# Altium footprint library UZohmADC.PcbLib: 54 footprints (part 2 of 4)
Each footprint in its own frame and in the unit in brackets; x right, y up, seen from the top. Pads: shape width x height; smd on the part's side, far side on the other; paste and mask are expansions set on the pad; w line width, h text height; cw(c..) or ccw(c..) is an arc to the next point about the centre after c.
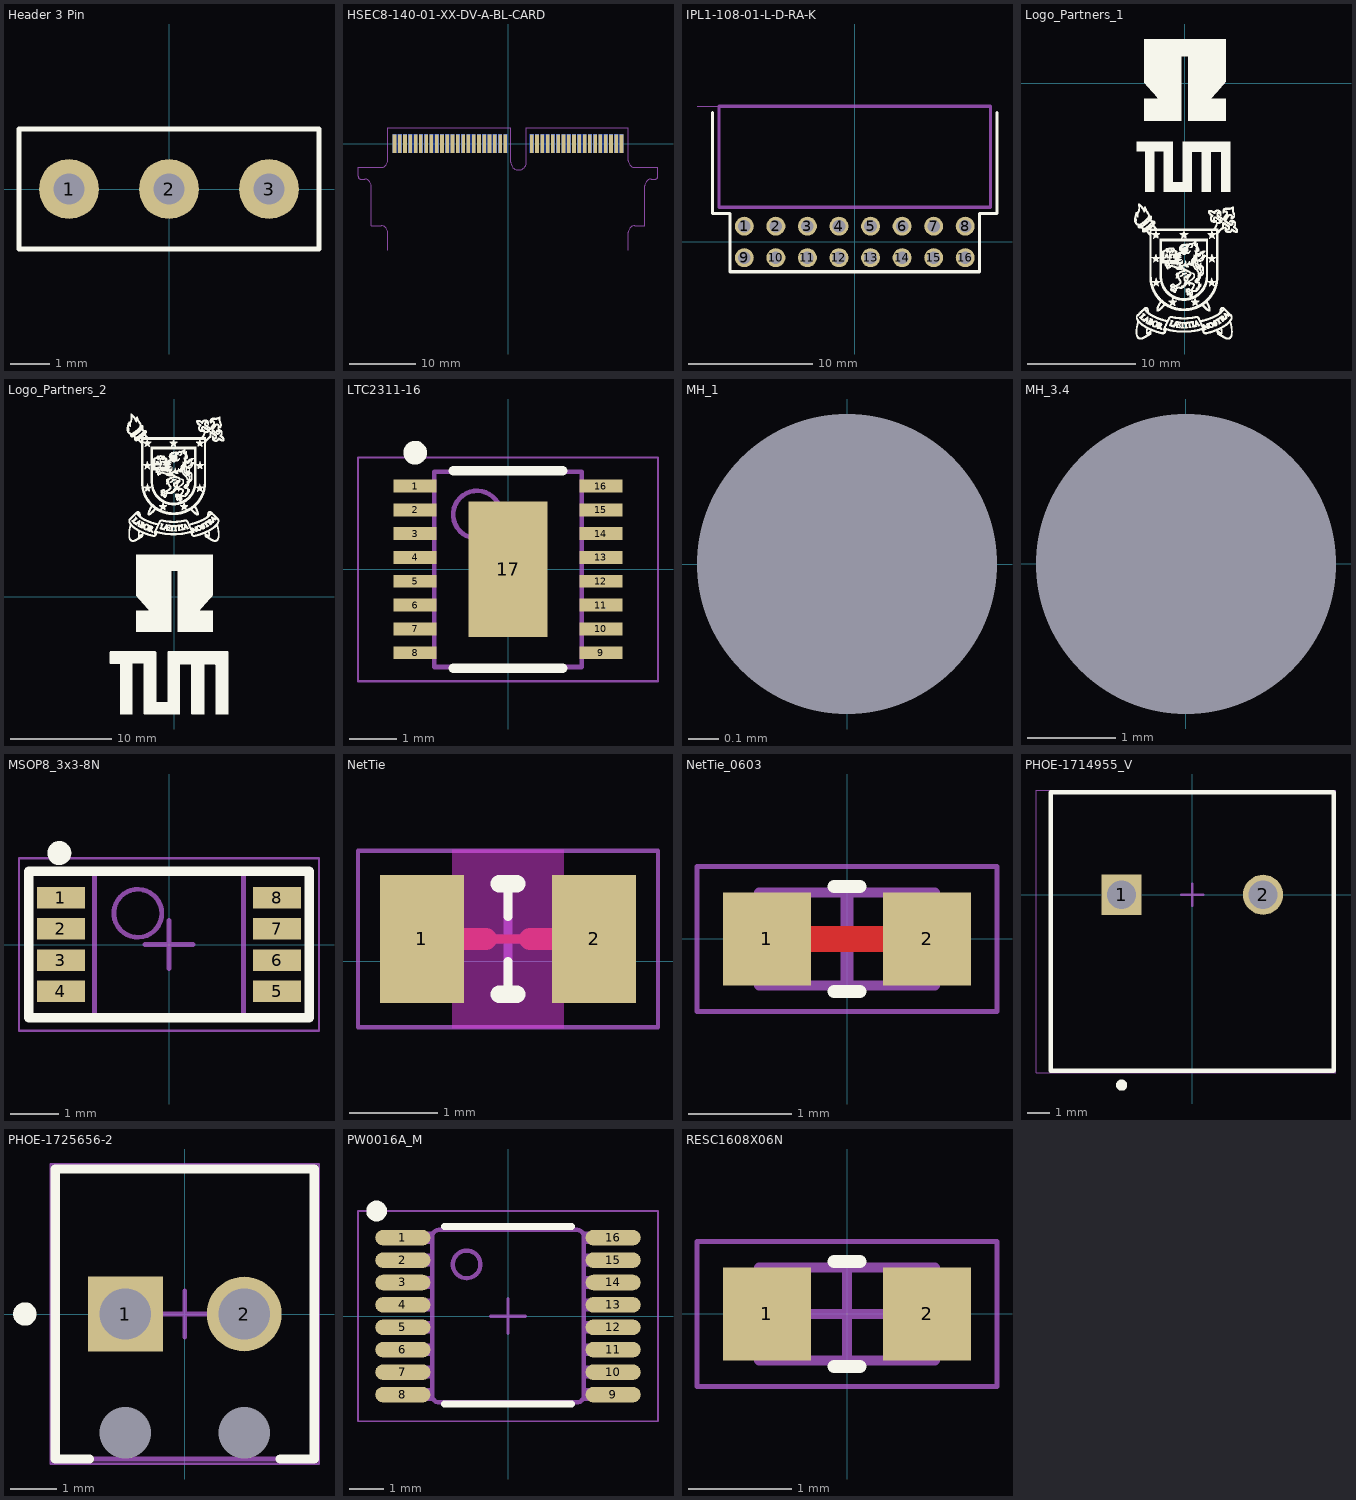
[diagram p1: the footprints below, top view; thin cyan lines are the x and y axes]

## Header 3 Pin [mil]
pads (3):
  round 60 hole 31.5: 1(-100,0) 2(0,0) 3(100,0)
Top Overlay:
  lines w5: -150,-60 -150,60 150,60 150,-60 -150,-60
3D body "zl201-3_p2-54_l7-62_w2-54_h8-89.stp": height 350, standoff -120, extent -150,-50 150,50

## HSEC8-140-01-XX-DV-A-BL-CARD [mm]
pads (80):
  rect 0.55x2.8 smd far side mask+0.05: 1(-17.2,0) 3(-16.4,0) 5(-15.6,0) 7(-14.8,0) 9(-14,0) 11(-13.2,0) 13(-12.4,0) 15(-11.6,0) 17(-10.8,0) 19(-10,0) 21(-9.2,0) 23(-8.4,0) 25(-7.6,0) 27(-6.8,0) 29(-6,0) 31(-5.2,0) 33(-4.4,0) 35(-3.6,0) 37(-2.8,0) 39(-2,0) 41(-1.2,0) 43(-0.4,0) 45(3.6,0) 47(4.4,0) 49(5.2,0) 51(6,0) 53(6.8,0) 55(7.6,0) 57(8.4,0) 59(9.2,0) 61(10,0) 63(10.8,0) 65(11.6,0) 67(12.4,0) 69(13.2,0) 71(14,0) 73(14.8,0) 75(15.6,0) 77(16.4,0) 79(17.2,0)
  rect 0.55x2.8 smd mask+0.05: 2(-17.2,0) 4(-16.4,0) 6(-15.6,0) 8(-14.8,0) 10(-14,0) 12(-13.2,0) 14(-12.4,0) 16(-11.6,0) 18(-10.8,0) 20(-10,0) 22(-9.2,0) 24(-8.4,0) 26(-7.6,0) 28(-6.8,0) 30(-6,0) 32(-5.2,0) 34(-4.4,0) 36(-3.6,0) 38(-2.8,0) 40(-2,0) 42(-1.2,0) 44(-0.4,0) 46(3.6,0) 48(4.4,0) 50(5.2,0) 52(6,0) 54(6.8,0) 56(7.6,0) 58(8.4,0) 60(9.2,0) 62(10,0) 64(10.8,0) 66(11.6,0) 68(12.4,0) 70(13.2,0) 72(14,0) 74(14.8,0) 76(15.6,0) 78(16.4,0) 80(17.2,0)
M5:
  lines w0.025: -18.225,-16.166 -18.225,-13.44 ccw(c-19.225,-13.44) -19.225,-12.44 -20.725,-12.44 -20.725,-6.38 ccw(c-21.725,-6.38) -21.725,-5.38 -22.325,-5.38 cw(c-22.325,-4.98) -22.725,-4.98 -22.725,-3.6 -19.225,-3.6 ccw(c-19.225,-2.6) -18.225,-2.6 -18.225,1.621 -18.225,2.4 0.4,2.4 0.4,1.621 0.4,-2.8 ccw(c1.6,-2.8) 2.8,-2.8 2.8,1.621 2.8,2.4 18.225,2.4 18.225,1.621 18.225,-2.6 ccw(c19.225,-2.6) 19.225,-3.6 22.725,-3.6 22.725,-4.98 cw(c22.325,-4.98) 22.325,-5.38 21.725,-5.38 ccw(c21.725,-6.38) 20.725,-6.38 20.725,-12.44 19.225,-12.44 ccw(c19.225,-13.44) 18.225,-13.44 18.225,-16.166
  text ".Designator" at 0,2.4 h1.02

## ID_ProjectRev [mm] "project name + revision number"
Top Overlay:
  text ".ProjectName .ProjectRevision / .Author .Date" at -2.727,-0.335 h1.78

## IPL1-108-01-L-D-RA-K [mil]
pads (16):
  round 60 hole 40 mask+3: 1(-350,50) 2(-250,50) 3(-150,50) 4(-50,50) 5(50,50) 6(150,50) 7(250,50) 8(350,50) 9(-350,-50) 10(-250,-50) 11(-150,-50) 12(-50,-50) 13(50,-50) 14(150,-50) 15(250,-50) 16(350,-50)
Top Overlay:
  lines w10: -450.79,410 -450.79,90.55 -395.79,90.55 -395.79,-94.49 395.79,-94.49 395.79,90 450.79,90 450.79,410
M5:
  lines w10: -430,110 430,110 430,430 -430,430 -430,110
  text ".Designator" at -21.14,260 h30
M16:
  lines w0.1: -500,430 300,430
3D body "IPL1-108-01-F-D-RA-K.stp": height 310, standoff -85, extent -430,-58.32 430,434.18

## Logo_Partners_1 [mm] "THN, TUM and USACH Logo"
Top Overlay:
  drawing of 11309 lines, arcs and shapes, not listed

## Logo_Partners_2 [mm] "USACH, THN and TUM Logo"
Top Overlay:
  drawing of 13619 lines, arcs and shapes, not listed

## LTC2311-16 [mm]
pads (17):
  rect 0.9x0.27 smd mask+0.05: 1(-1.95,1.75) 2(-1.95,1.25) 3(-1.95,0.75) 4(-1.95,0.25) 5(-1.95,-0.25) 6(-1.95,-0.75) 7(-1.95,-1.25) 8(-1.95,-1.75) 9(1.95,-1.75) 10(1.95,-1.25) 11(1.95,-0.75) 12(1.95,-0.25) 13(1.95,0.25) 14(1.95,0.75) 15(1.95,1.25) 16(1.95,1.75)
  rect 1.65x2.85 smd: 17(0,0)
Top Overlay:
  circle w0.25: c-1.95,2.45 r0.125
  lines w0.2: -1.15,-2.075 1.15,-2.075 ; -1.15,2.075 1.15,2.075
M5:
  lines w0.1: -1.55,-2.05 -1.55,2.05 1.55,2.05 1.55,-2.05 -1.55,-2.05
  text ".Designator" at 0,0 h1.02
M13:
  circle w0.1: c-0.65,1.15 r0.5
M15:
  lines w0.05: -3.15,-2.35 3.15,-2.35 3.15,2.35 -3.15,2.35 -3.15,-2.35
  lines w0.1: -0.5,0 0.5,0 ; 0,-0.5 0,0.5
3D body: height 1.1, standoff 0.05, extent -1.55,-2.05 1.55,2.05

## MH_1 [mm]
pads (1):
  round 0 hole 1 unplated: 1(0,0)

## MH_3.4 [mm]
pads (1):
  round 0 hole 3.4 unplated: 1(0,0)

## MSOP8_3x3-8N [mm] "TSOP, 8-Leads, Body 3,00x3,00mm, Pitch 0,65mm, IPC Medium Density"
height 1
pads (8):
  rect 1x0.45 smd mask+0.051: 1(-2.25,0.975) 2(-2.25,0.325) 3(-2.25,-0.325) 4(-2.25,-0.975) 5(2.25,-0.975) 6(2.25,-0.325) 7(2.25,0.325) 8(2.25,0.975)
Top Overlay:
  circle w0.25: c-2.286,1.905 r0.125
  lines w0.2: -2.921,-1.524 -2.921,1.524 2.921,1.524 2.921,-1.524 -2.921,-1.524
M5:
  circle w0.1: c-0.65,0.65 r0.5
  lines w0.1: -1.55,-1.55 -1.55,1.55 1.55,1.55 1.55,-1.55 -1.55,-1.55
  text ".Designator" at 0,0 h1.52
M15:
  lines w0.05: -3.125,-1.8 -3.125,1.8 3.125,1.8 3.125,-1.8 -3.125,-1.8
  lines w0.1: -0.5,0 0.5,0 ; 0,-0.5 0,0.5
3D body "User Library-MSOP8.STEP": height 1.1, standoff 0, extent -2.469,-1.55 2.469,1.55

## NetTie [mm]
pads (2):
  rect 0.95x1.45 smd: 1(-3.769,0.254) 2(-1.819,0.254)
Top Layer:
  lines w0.102: -3.048,0.254 -2.54,0.254
  lines w0.254: -3.769,0.254 -3.048,0.254 ; -2.54,0.254 -1.778,0.254
Top Overlay:
  lines w0.102: -2.794,-0.254 -2.794,0 ; -2.794,0.508 -2.794,0.879
  lines w0.2: -2.894,-0.371 -2.694,-0.371 ; -2.894,0.879 -2.694,0.879
Keep-Out Layer:
  rectangle: -3.429,-0.762 -2.159,1.27
M15:
  lines w0.05: -4.494,-0.746 -4.494,1.254 -1.094,1.254 -1.094,-0.746 -4.494,-0.746
  lines w0.1: -3.294,0.254 -2.294,0.254 ; -2.794,-0.246 -2.794,0.762

## NetTie_0603 [mm] "Chip Resistor, 2-Leads, Body 1,60x0,80mm, IPC Medium Density"
height 0.55
pads (2):
  rect 0.85x0.9 smd: 1(-0.775,0) 2(0.775,0)
Top Layer:
  lines w0.254: -0.775,0 0.775,0
Top Overlay:
  lines w0.127: -0.127,-0.508 0.127,-0.508 ; -0.127,0.508 0.127,0.508
M5:
  lines w0.1: -0.85,-0.45 -0.85,0.45 0.85,0.45 0.85,-0.45 -0.85,-0.45
  text ".Designator" at 0,0 h1.02
M8:
  lines w0.127: 0,-0.5 0,0.5
M15:
  lines w0.05: -1.45,-0.7 1.45,-0.7 1.45,0.7 -1.45,0.7 -1.45,-0.7
  lines w0.1: -0.45,0 0.45,0 ; 0,-0.45 0,0.45

## PHOE-1714955_V [mm] "Terminal Block, 2-Leads, Body 12.7x12.5mm, Pitch 6.35mm"
height 21.5
pads (2):
  rect 1.8x1.8 hole 1.3: 1(-3.175,0)
  round 1.8 hole 1.3: 2(3.175,0)
Top Overlay:
  circle w0.25: c-3.175,-8.55 r0.125
  lines w0.2: -6.35,-7.9 -6.35,4.6 6.35,4.6 6.35,-7.9 -6.35,-7.9
M5:
  lines w0.1: -6.35,-7.9 -6.35,4.6 6.35,4.6 6.35,-7.9 -6.35,-7.9
  text ".Designator" at 2.413,5.08 h1.52
M15:
  lines w0.05: -7.02,-8 -7.02,4.7 6.45,4.7 6.45,-8 -7.02,-8
  lines w0.1: -0.5,0 0.5,0 ; 0,-0.5 0,0.5
3D body "1714955_03.stp": height 21.51, standoff -4.99, extent -6.92,-7.9 6.35,4.6

## PHOE-1725656-2 [mm] "Connector, 2-Leads, Body 6.2x5.4mm, Pitch 2.54mm"
height 8.5
pads (4):
  rect 1.6x1.6 hole 1.1: 1(-1.27,0)
  round 1.6 hole 1.1: 2(1.27,0)
  round 0 hole 1.1 unplated: MH1(-1.27,-2.54) MH2(1.27,-2.54)
Top Overlay:
  circle w0.25: c-3.42,0 r0.125
  lines w0.2: -2.038,-3.1 -2.77,-3.1 -2.77,3.1 2.77,3.1 2.77,-3.1 2.038,-3.1
M5:
  lines w0.1: -2.77,-3.1 -2.77,3.1 2.77,3.1 2.77,-3.1 -2.77,-3.1
  text ".Designator" at 0.254,3.429 h1.52
M15:
  lines w0.05: -2.87,-3.2 -2.87,3.2 2.87,3.2 2.87,-3.2 -2.87,-3.2
  lines w0.1: -0.5,0 0.5,0 ; 0,-0.5 0,0.5
3D body "1725656.stp": height 9, standoff -3, extent -2.77,-3.1 2.77,3.1

## PW0016A_M [mm]
pads (16):
  oval 1.6x0.45 smd paste+0 mask+0.051: 1(-3.05,2.275) 2(-3.05,1.625) 3(-3.05,0.975) 4(-3.05,0.325) 5(-3.05,-0.325) 6(-3.05,-0.975) 7(-3.05,-1.625) 8(-3.05,-2.275) 9(3.05,-2.275) 10(3.05,-1.625) 11(3.05,-0.975) 12(3.05,-0.325) 13(3.05,0.325) 14(3.05,0.975) 15(3.05,1.625) 16(3.05,2.275)
Top Overlay:
  lines w0.2: -1.85,-2.55 1.85,-2.55 ; -1.85,2.6 1.85,2.6
  lines w0.3: -3.81,2.898 cw(c-3.81,3.048) -3.81,3.198 cw(c-3.81,3.048) -3.81,2.898
  text ".Designator" at -3.302,3.198 h1.27
M5:
  drawing of 202 lines, arcs and shapes, not listed
  text ".Designator" at -2.032,-1.27 h1.27
M15:
  lines w0.05: -4.35,-3.05 -4.35,3.05 4.35,3.05 4.35,-3.05 -4.35,-3.05
  lines w0.1: -0.5,0 0.5,0 ; 0,-0.5 0,0.5
3D body: height 0.25, standoff 0, extent 0,0 0.254,0.254
3D body "PW0016A.stp": height 1.13, standoff 0, extent -3.2,-2.5 3.2,2.5

## RESC1608X06N [mm] "Chip Resistor, 2-Leads, Body 1,60x0,80mm, IPC Medium Density"
height 0.55
pads (2):
  rect 0.85x0.9 smd: 1(-0.775,0) 2(0.775,0)
Top Overlay:
  lines w0.127: -0.127,-0.508 0.127,-0.508 ; -0.127,0.508 0.127,0.508
M5:
  lines w0.1: -0.85,-0.45 -0.85,0.45 0.85,0.45 0.85,-0.45 -0.85,-0.45
  text ".Designator" at 0,0 h1.02
M15:
  lines w0.05: -1.45,-0.7 -1.45,0.7 1.45,0.7 1.45,-0.7 -1.45,-0.7
  lines w0.1: -0.45,0 0.45,0 ; 0,-0.45 0,0.45
3D body "0603-Rchip.step": height 0.44, standoff -0.01, extent -0.8,-0.4 0.8,0.4